# Altium footprint library 3D封装库.PcbLib: 716 footprints (part 43 of 45)
Each footprint in its own frame and in the unit in brackets; x right, y up, seen from the top. Pads: shape width x height; smd on the part's side, far side on the other; paste and mask are expansions set on the pad; w line width, h text height; cw(c..) or ccw(c..) is an arc to the next point about the centre after c.
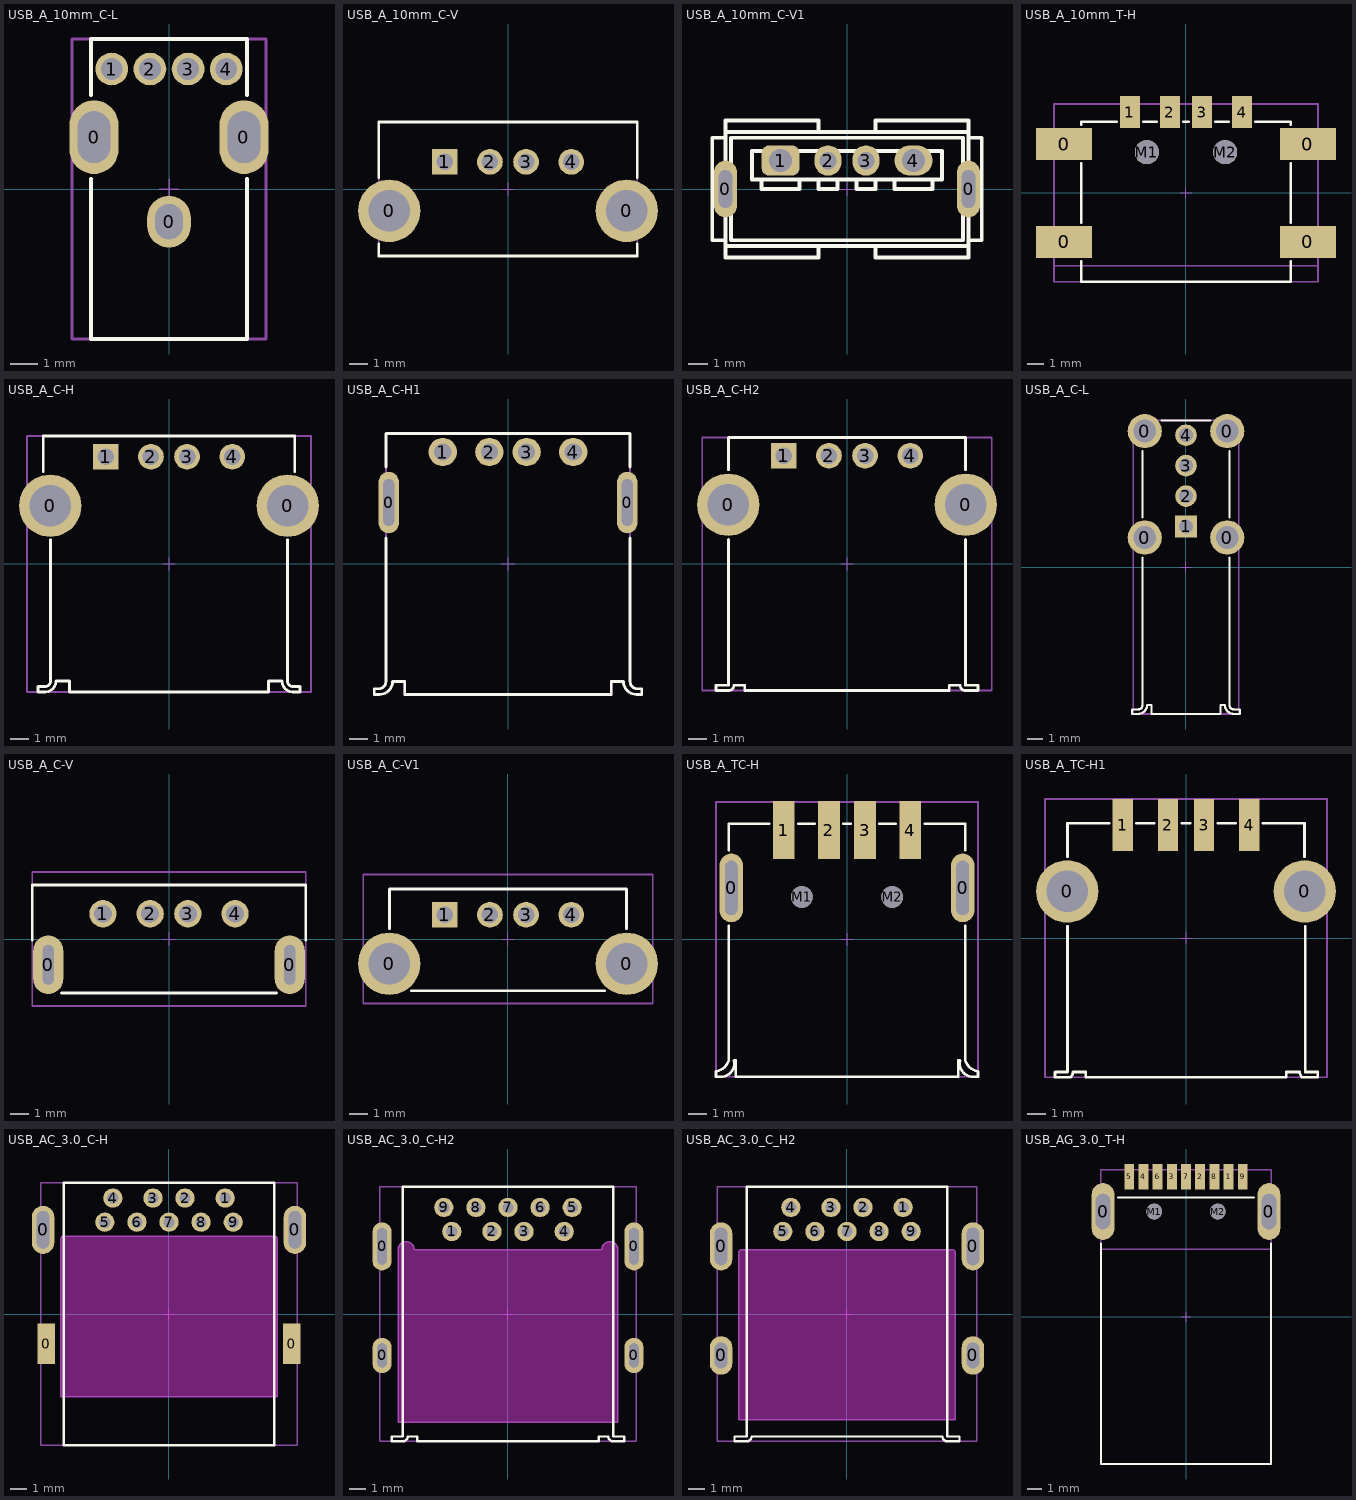
[diagram p42: the footprints below, top view; thin cyan lines are the x and y axes]

## USB_A_10mm_C-L [mm] "USB 2.0 Type A Up Right THT"
height 14.2
pads (7):
  oval 1.8x2.7 hole 1.2 slot 1.9 at 90 deg: 0(-2.75,1.9) 0(2.75,1.9)
  oval 1.6x1.9 hole 1 slot 1.3 at 90 deg: 0(0,-1.2)
  round 1.2 hole 0.8: 1(-2.1,4.4) 2(-0.7,4.4) 3(0.7,4.4) 4(2.1,4.4)
Top Overlay:
  lines w0.15: -2.86,0.36 -2.86,-5.5 2.86,-5.5 2.86,0.36 ; -2.86,3.44 -2.86,5.5 2.86,5.5 2.86,3.44
Mechanical 1:
  text "PCB Thickness 1.2mm" at -3.5,-6.3 h0.76
Mechanical 13:
  lines w0.1: -3.56,-5.5 3.56,-5.5 3.56,5.5 -3.56,5.5 -3.56,-5.5
Mechanical 15:
  lines w0.05: -0.35,0 0.35,0 ; 0,-0.35 0,0.35
3D body "614004184726.stp": height 14.3, standoff -2.74, extent -3.56,-5.5 3.56,5.5

## USB_A_10mm_C-V [mm] "USB 2.0 Type A Vertical Short Type THT"
height 10
pads (6):
  round 3.45 hole 2.3: 0(-6.57,-1.21) 0(6.57,-1.21)
  rect 1.42x1.42 hole 0.92: 1(-3.5,1.5)
  round 1.42 hole 0.92: 2(-1,1.5) 3(1,1.5) 4(3.5,1.5)
Top Overlay:
  lines w0.15: -7.15,-3.04 -7.15,-3.7 7.15,-3.7 7.15,-3.04 ; -7.15,0.62 -7.15,3.7 7.15,3.7 7.15,0.62
Mechanical 13:
  lines w0.1: -7.15,-3.7 7.15,-3.7 7.15,3.7 -7.15,3.7 -7.15,-3.7
Mechanical 15:
  lines w0.05: -0.35,0 0.35,0 ; 0,-0.35 0,0.35
3D body "614004185023.stp": height 10.05, standoff -2.95, extent -7.15,-3.7 7.15,3.7

## USB_A_10mm_C-V1 [mm] "USB 2.0 Type A Vertical Short Type THT"
height 10
pads (6):
  oval 1.2x3 hole 0.7 slot 2 at 90 deg: 0(-6.4,0) 0(6.4,0)
  rrect50% 2x1.6 hole 1.21: 1(-3.5,1.5)
  oval 1.42x1.6 hole 0.92: 2(-1,1.5) 3(1,1.5)
  oval 2x1.6 hole 1.21: 4(3.5,1.5)
Top Overlay:
  lines w0.203: -6.4,-2.7 -7.1,-2.7 -7.1,2.7 -6.4,2.7 ; -4.5,0.5 -4.5,0 -2.5,0 -2.5,0.5 ; -1.5,-3 -1.5,-3.6 -6.4,-3.6 -6.4,-3 ; -1.5,0.5 -1.5,0 -0.5,0 -0.5,0.5 ; -1.5,3 -1.5,3.6 -6.4,3.6 -6.4,3 ; 0.5,0.5 0.5,0 1.5,0 1.5,0.5 ; 1.5,-3 1.5,-3.6 6.4,-3.6 6.4,-3 ; 1.5,3 1.5,3.6 6.4,3.6 6.4,3 ; 2.5,0.5 2.5,0 4.5,0 4.5,0.5 ; 6.4,-2.7 7.1,-2.7 7.1,2.7 6.4,2.7 ; -6.4,-3 -6.4,3 ; -6.4,-3 6.4,-3 ; -6.4,3 6.4,3 ; 6.4,-3 6.4,3 ; -6.1,-2.7 -6.1,2.7 6.1,2.7 6.1,-2.7 -6.1,-2.7 ; -5,0.5 -5,2 5,2 5,0.5 -5,0.5
Mechanical 15:
  lines w0.05: -0.35,0 0.35,0 ; 0,-0.35 0,0.35
3D body "614004185023.stp": height 10.05, standoff -2.95, extent -7.15,-3.7 7.15,3.7

## USB_A_10mm_T-H [mm] "USB 2.0 Type A Horizontal SMT Short Type"
height 6.3
pads (10):
  rect 3.5x2 smd: 0(-7.625,-3.055) 0(-7.625,3.045) 0(7.625,-3.055) 0(7.625,3.045)
  rect 1.25x2 smd: 1(-3.5,5.045) 2(-1,5.045) 3(1,5.045) 4(3.5,5.045)
  round 1.5 hole 1.5 unplated: M1(-2.45,2.545) M2(2.45,2.545)
Top Overlay:
  lines w0.15: -6.55,-4.255 -6.55,-5.555 6.55,-5.555 6.55,-4.255 ; -6.55,-1.855 -6.55,1.845 ; -6.55,4.245 -6.55,4.445 -4.32,4.445 ; -2.68,4.445 -1.82,4.445 ; -0.18,4.445 0.18,4.445 ; 1.82,4.445 2.68,4.445 ; 4.32,4.445 6.55,4.445 6.55,4.245 ; 6.55,-1.855 6.55,1.845
Mechanical 1:
  lines w0.1: -8.25,-4.555 8.25,-4.555
  text "PCB Edge" at -2,-4.155 h1
Mechanical 13:
  lines w0.1: -8.25,-5.555 -8.25,5.555 8.25,5.555 8.25,-5.555 -8.25,-5.555
Mechanical 15:
  lines w0.05: -0.35,0 0.35,0 ; 0,-0.35 0,0.35
3D body "629104190121.stp": height 6.37, standoff -0.1, extent -8.25,-5.555 8.25,5.554

## USB_A_C-H [mm] "USB 2.0 Type A Horizontal THT"
height 6.9
pads (6):
  round 3.45 hole 2.3: 0(-6.57,3.225) 0(6.57,3.225)
  rect 1.42x1.42 hole 0.92: 1(-3.5,5.935)
  round 1.42 hole 0.92: 2(-1,5.935) 3(1,5.935) 4(3.5,5.935)
Top Overlay:
  lines w0.15: -6.95,5.115 -6.95,7.075 6.95,7.075 6.95,5.115 ; -6.55,1.335 -6.55,-6.475 cw(c-6.85,-6.475) -6.85,-6.775 -7.25,-6.775 -7.25,-7.075 -6.85,-7.075 ccw(c-6.85,-6.475) -6.25,-6.475 -5.5,-6.475 -5.5,-7.075 5.5,-7.075 5.5,-6.475 6.25,-6.475 ccw(c6.85,-6.475) 6.85,-7.075 7.25,-7.075 7.25,-6.775 6.85,-6.775 cw(c6.85,-6.475) 6.55,-6.475 6.55,1.335
Mechanical 1:
  text "PCB Thickness 1.6mm" at -3.15,-7.7 h0.76
Mechanical 13:
  lines w0.1: -7.85,-7.075 7.85,-7.075 7.85,7.075 -7.85,7.075 -7.85,-7.075
Mechanical 15:
  lines w0.05: -0.35,0 0.35,0 ; 0,-0.35 0,0.35
3D body "614004190021.stp": height 7.7, standoff -3.7, extent -7.85,-7.075 7.85,7.075

## USB_A_C-H1 [mm] "USB Type A Horizontal THR"
height 7.25
pads (6):
  oval 1.1x3.3 hole 0.6 slot 2.5 at 90 deg: 0(-6.4,3.3) 0(6.4,3.3)
  round 1.52 hole 0.92: 1(-3.5,6.01) 2(-1,6.01) 3(1,6.01) 4(3.5,6.01)
Top Overlay:
  lines w0.15: -6.972,-6.7 -7.175,-6.7 -7.175,-7 -6.895,-7 ccw(c-6.895,-6.3) -6.195,-6.3 -5.545,-6.3 -5.545,-7 5.545,-7 5.545,-6.3 6.195,-6.3 ccw(c6.895,-6.3) 6.895,-7 7.175,-7 7.175,-6.7 6.972,-6.7 ; -6.972,-6.699 ccw(c-6.95,-6.3) -6.55,-6.3 -6.55,1.4 ; -6.55,5.2 -6.55,7 6.55,7 6.55,5.2 ; 6.55,1.4 6.55,-6.3 ccw(c6.95,-6.3) 6.972,-6.699
Mechanical 13:
  lines w0.1: -6.972,-6.7 -7.175,-6.7 -7.175,-7 -6.895,-7 ccw(c-6.895,-6.3) -6.195,-6.3 -5.545,-6.3 -5.545,-7 5.545,-7 5.545,-6.3 6.195,-6.3 ccw(c6.895,-6.3) 6.895,-7 7.175,-7 7.175,-6.7 6.972,-6.7 ; -6.972,-6.699 ccw(c-6.95,-6.3) -6.55,-6.3 -6.55,7 6.55,7 6.55,-6.3 ccw(c6.95,-6.3) 6.972,-6.699
Mechanical 15:
  lines w0.05: -0.35,0 0.35,0 ; 0,-0.35 0,0.35
3D body "61410416021R.stp": height 7.5, standoff -2.19, extent -7.225,-7 7.225,7

## USB_A_C-H2 [mm] "USB 2.0 Type A Horizontal"
height 6.9
pads (6):
  round 3.45 hole 2.3: 0(-6.57,3.28) 0(6.57,3.28)
  rect 1.42x1.42 hole 0.92: 1(-3.5,5.99)
  round 1.42 hole 0.92: 2(-1,5.99) 3(1,5.99) 4(3.5,5.99)
Top Overlay:
  lines w0.15: -6.55,1.35 -6.55,-6.7 -7.25,-6.7 -7.25,-7 -6.56,-7 ccw(c-6.55,-6.7) -6.25,-6.7 -5.65,-6.7 -5.65,-7 5.65,-7 5.65,-6.7 6.25,-6.7 ccw(c6.55,-6.7) 6.56,-7 7.25,-7 7.25,-6.7 6.55,-6.7 6.55,1.35 ; -6.55,5.21 -6.55,7 6.55,7 6.55,5.21
Mechanical 1:
  text "PCB Thickness 1.6mm" at -3.15,-7.7 h0.76
Mechanical 13:
  lines w0.1: -8,-7 8,-7 8,7 -8,7 -8,-7
Mechanical 15:
  lines w0.05: -0.35,0 0.35,0 ; 0,-0.35 0,0.35
3D body "61400416021.stp": height 7.63, standoff -4.06, extent -7.999,-7 7.999,7

## USB_A_C-L [mm] "USB 2.0 Type A Up Right"
height 14.5
pads (8):
  round 2.25 hole 1.5: 0(-2.71,1.95) 0(-2.71,8.95) 0(2.71,1.95) 0(2.71,8.95)
  rect 1.42x1.42 hole 0.92: 1(0,2.68)
  round 1.42 hole 0.92: 2(0,4.68) 3(0,6.68) 4(0,8.68)
Top Overlay:
  lines w0.15: -2.86,0.63 -2.86,-9.06 cw(c-3.15,-9.06) -3.15,-9.35 -3.55,-9.35 -3.55,-9.65 -3.15,-9.65 ccw(c-3.15,-9.06) -2.56,-9.06 -2.27,-9.06 -2.27,-9.65 2.27,-9.65 2.27,-9.06 2.56,-9.06 ccw(c3.15,-9.06) 3.15,-9.65 3.55,-9.65 3.55,-9.35 3.15,-9.35 cw(c3.15,-9.06) 2.86,-9.06 2.86,0.63 ; -2.86,3.27 -2.86,7.64 ; -1.59,9.65 1.59,9.65 ; 2.86,3.27 2.86,7.64
Mechanical 13:
  lines w0.1: -3.475,-9.65 -3.475,9.65 3.475,9.65 3.475,-9.65 -3.475,-9.65
Mechanical 15:
  lines w0.05: -0.35,0 0.35,0 ; 0,-0.35 0,0.35
3D body "614004134726.stp": height 14.51, standoff -3.8, extent -3.55,-9.65 3.55,9.65

## USB_A_C-V [mm] "USB Type A Vertical THR"
height 14.9
pads (6):
  oval 1.6x3.1 hole 0.6 slot 2.1 at 90 deg: 0(-6.4,-1.37) 0(6.4,-1.37)
  round 1.45 hole 0.95: 1(-3.5,1.34) 2(-1,1.34) 3(1,1.34) 4(3.5,1.34)
Top Overlay:
  lines w0.15: -7.25,-0.05 -7.25,2.86 7.25,2.86 7.25,-0.05 ; -5.7,-2.86 5.7,-2.86
Mechanical 13:
  lines w0.1: -7.25,-3.56 7.25,-3.56 7.25,3.56 -7.25,3.56 -7.25,-3.56
Mechanical 15:
  lines w0.05: -0.35,0 0.35,0 ; 0,-0.35 0,0.35
3D body "614104135023R.stp": height 14.99, standoff -2.1, extent -7.25,-3.56 7.25,3.56

## USB_A_C-V1 [mm] "USB 2.0 Type A Vertical"
height 15
pads (6):
  round 3.45 hole 2.3: 0(-6.57,-1.37) 0(6.57,-1.37)
  rect 1.42x1.42 hole 0.92: 1(-3.5,1.34)
  round 1.42 hole 0.92: 2(-1,1.34) 3(1,1.34) 4(3.5,1.34)
Top Overlay:
  lines w0.15: -6.55,0.56 -6.55,2.76 6.55,2.76 6.55,0.56 ; -5.35,-2.86 5.34,-2.86
Mechanical 1:
  text "PCB Thickness 1.6mm" at -3.4,-4.1 h0.76
Mechanical 13:
  lines w0.1: -8,-3.56 8,-3.56 8,3.56 -8,3.56 -8,-3.56
Mechanical 15:
  lines w0.05: -0.35,0 0.35,0 ; 0,-0.35 0,0.35
3D body "614004135023.stp": height 15.02, standoff -4.28, extent -7.999,-3.56 7.999,3.56

## USB_A_TC-H [mm] "USB 2.0 Type A Horizontal SMT with pegs"
height 7
pads (8):
  oval 1.3x3.8 hole 0.7 slot 3 at 90 deg: 0(-6.4,2.85) 0(6.4,2.85)
  rect 1.2x3.2 smd: 1(-3.5,6.05) 2(-1,6.05) 3(1,6.05) 4(3.5,6.05)
  round 1.2 hole 1.2 unplated: M1(-2.5,2.35) M2(2.5,2.35)
Top Overlay:
  lines w0.15: -7.25,-7.308 -7.25,-7.6 -6.87,-7.599 ccw(c-6.983,-6.857) -6.25,-6.7 -6.15,-6.7 -6.15,-7.6 6.15,-7.6 6.15,-6.7 6.25,-6.7 ccw(c6.983,-6.857) 6.87,-7.599 7.25,-7.6 7.25,-7.308 ; -7.249,-7.308 ccw(c-7.39,-6.44) -6.55,-6.7 -6.55,0.76 ; -6.55,4.94 -6.55,6.4 -4.3,6.4 ; -2.7,6.4 -1.8,6.4 ; -0.2,6.4 0.2,6.4 ; 1.8,6.4 2.7,6.4 ; 4.3,6.4 6.55,6.4 6.55,4.94 ; 6.55,0.76 6.55,-6.7 ccw(c7.39,-6.44) 7.249,-7.308
Mechanical 1:
  text "PCB Thickness 1.6mm" at -3.15,-8.4 h0.76
Mechanical 13:
  lines w0.1: -7.25,-7.6 7.25,-7.6 7.25,7.6 -7.25,7.6 -7.25,-7.6
Mechanical 15:
  lines w0.05: -0.35,0 0.35,0 ; 0,-0.35 0,0.35
3D body "629104151021.stp": height 7.4, standoff -2.1, extent -7.25,-7.6 7.25,7.6

## USB_A_TC-H1 [mm] "USB 2.0 SMT Type A Horizontal"
height 7.12
pads (6):
  round 3.45 hole 2.3: 0(-6.57,2.58) 0(6.57,2.58)
  rect 1.12x2.88 smd: 1(-3.5,6.25) 2(-1,6.25) 3(1,6.25) 4(3.5,6.25)
Top Overlay:
  lines w0.15: -6.55,0.66 -6.55,-7.4 -7.25,-7.4 -7.25,-7.7 -6.39,-7.7 ; -6.55,4.5 -6.55,6.35 -4.26,6.35 ; -6.388,-7.702 ccw(c-6.65,-7.4) -6.25,-7.4 -5.55,-7.4 -5.55,-7.7 5.55,-7.7 5.55,-7.4 6.29,-7.4 ccw(c6.69,-7.4) 6.428,-7.702 ; -2.75,6.35 -1.76,6.35 ; -0.24,6.35 0.24,6.35 ; 1.75,6.35 2.74,6.35 ; 4.26,6.35 6.55,6.35 6.55,4.5 ; 6.43,-7.7 7.29,-7.7 7.29,-7.4 6.59,-7.4 6.59,0.66
Mechanical 13:
  lines w0.1: -7.8,-7.7 -7.8,7.7 7.8,7.7 7.8,-7.7 -7.8,-7.7
Mechanical 15:
  lines w0.05: -0.35,0 0.35,0 ; 0,-0.35 0,0.35
3D body "62900416021.stp": height 7.81, standoff -3.89, extent -7.81,-7.7 7.81,7.705

## USB_AC_3.0_C-H [mm] "USB 3.0 Type A Reverse Horizontal with Offset 1.75mm"
height 7.4
pads (13):
  oval 1.4x3 hole 0.8 slot 2.35 at 90 deg: 0(-7.85,5.245) 0(7.85,5.245)
  rect 1.1x2.5 smd: 0(-7.65,-1.855) 0(7.65,-1.855)
  round 1.2 hole 0.7: 1(3.5,7.225) 2(1,7.225) 3(-1,7.225) 4(-3.5,7.225) 5(-4,5.725) 6(-2,5.725) 7(0,5.725) 8(2,5.725) 9(4,5.725)
Top Overlay:
  lines w0.15: -6.55,-8.185 6.55,-8.185 6.55,8.185 -6.55,8.185 -6.55,-8.185
Keep-Out Layer:
  board cut-out: -6.75,-5.155 -6.75,4.675 -6.75,4.709 -6.724,4.771 -6.676,4.819 -6.614,4.845 -6.58,4.845 6.58,4.845 6.614,4.845 6.676,4.819 6.724,4.771 6.75,4.709 6.75,4.675 6.75,-5.155
Mechanical 1:
  lines w0.1: -6.75,-5.155 -6.75,4.675 cw(c-6.58,4.675) -6.58,4.845 6.58,4.845 cw(c6.58,4.675) 6.75,4.675 6.75,-5.155 -6.75,-5.155
  text "PCB Cutout Area" at -4.75,-0.15 h1.5
Mechanical 13:
  lines w0.1: -8,-8.185 8,-8.185 8,8.185 -8,8.185 -8,-8.185
Mechanical 15:
  lines w0.05: -0.35,0 0.35,0 ; 0,-0.35 0,0.35
3D body "692121330100.stp": height 2.99, standoff -4.41, extent -8,-8.185 8,8.185

## USB_AC_3.0_C-H2 [mm] "USB 3.0 Type A Horizontal with Offset 1.04mm"
height 3.9
pads (13):
  oval 1.2x2.2 hole 0.6 slot 1.5 at 90 deg: 0(-7.85,-2.585) 0(7.85,-2.585)
  oval 1.2x3 hole 0.6 slot 2.3 at 90 deg: 0(-7.85,4.215) 0(7.85,4.215)
  round 1.2 hole 0.7: 1(-3.5,5.145) 2(-1,5.145) 3(1,5.145) 4(3.5,5.145) 5(4,6.645) 6(2,6.645) 7(0,6.645) 8(-2,6.645) 9(-4,6.645)
Top Overlay:
  lines w0.15: -7.25,-7.935 -6.56,-7.935 ccw(c-6.55,-7.635) -6.25,-7.635 -5.65,-7.635 -5.65,-7.935 5.65,-7.935 5.65,-7.635 6.25,-7.635 ccw(c6.55,-7.635) 6.56,-7.935 7.25,-7.935 7.25,-7.635 6.55,-7.635 6.55,7.935 -6.55,7.935 -6.55,-7.635 -7.25,-7.635 -7.25,-7.935
Keep-Out Layer:
  board cut-out: -6.85,-6.755 6.85,-6.755 6.85,4.015 6.85,4.115 6.774,4.298 6.633,4.439 6.449,4.515 6.251,4.515 6.067,4.439 5.926,4.298 5.85,4.115 5.85,4.015 -5.85,4.015 -5.85,4.115 -5.926,4.298 -6.067,4.439 -6.251,4.515 -6.449,4.515 -6.633,4.439 -6.774,4.298 -6.85,4.115 -6.85,4.015
Mechanical 1:
  lines w0.1: -6.85,-6.755 6.85,-6.755 6.85,4.015 ccw(c6.35,4.015) 5.85,4.015 -5.85,4.015 ccw(c-6.35,4.015) -6.85,4.015 -6.85,-6.755
  text "PCB Cutout Area" at -4.7,-1.425 h1.5
Mechanical 13:
  lines w0.1: -8,-7.935 -8,7.935 8,7.935 8,-7.935 -8,-7.935
Mechanical 15:
  lines w0.05: -0.35,0 0.35,0 ; 0,-0.35 0,0.35
3D body "692121230100.stp": height 4.6, standoff -2.52, extent -8,-7.935 8,7.935

## USB_AC_3.0_C_H2 [mm] "USB 3.0 Type A Reverse Horizontal w. Offset 0.14mm"
height 5.12
pads (13):
  oval 1.4x2.4 hole 0.8 slot 1.6 at 90 deg: 0(-7.85,-2.585) 0(7.85,-2.585)
  oval 1.4x3 hole 0.8 slot 2.35 at 90 deg: 0(-7.85,4.215) 0(7.85,4.215)
  round 1.2 hole 0.7: 1(3.5,6.645) 2(1,6.645) 3(-1,6.645) 4(-3.5,6.645) 5(-4,5.145) 6(-2,5.145) 7(0,5.145) 8(2,5.145) 9(4,5.145)
Top Overlay:
  lines w0.15: -7.01,-7.935 -6.26,-7.935 ccw(c-6.25,-7.635) -5.95,-7.635 5.95,-7.635 ccw(c6.25,-7.635) 6.26,-7.935 7.01,-7.935 7.01,-7.635 6.25,-7.635 6.25,7.935 -6.25,7.935 -6.25,-7.635 -7.01,-7.635 -7.01,-7.935
Keep-Out Layer:
  board cut-out: -6.75,-6.585 6.75,-6.585 6.75,3.815 6.75,3.855 6.72,3.928 6.663,3.985 6.59,4.015 6.55,4.015 -6.55,4.015 -6.59,4.015 -6.663,3.985 -6.72,3.928 -6.75,3.855 -6.75,3.815
Mechanical 1:
  lines w0.1: -6.75,-6.585 6.75,-6.585 6.75,3.815 ccw(c6.55,3.815) 6.55,4.015 -6.55,4.015 ccw(c-6.55,3.815) -6.75,3.815 -6.75,-6.585
  text "PCB Cutout Area" at -5,-1.57 h1.5
Mechanical 13:
  lines w0.1: -8.078,-7.935 8.078,-7.935 8.078,7.935 -8.078,7.935 -8.078,-7.935
Mechanical 15:
  lines w0.05: -0.35,0 0.35,0 ; 0,-0.35 0,0.35
3D body "692121130100.stp": height 4.05, standoff -3.67, extent -8.078,-7.935 8.078,7.935

## USB_AG_3.0_T-H [mm] "USB 3.0 Type A SMT Plug with Clip"
height 4.5
pads (13):
  oval 1.6x4 hole 1 slot 2.5 at 90 deg: 0(-5.85,7.425) 0(5.85,7.425)
  rect 0.7x1.8 smd: 1(3,9.875) 2(1,9.875) 3(-1,9.875) 4(-3,9.875) 5(-4,9.875) 6(-2,9.875) 7(0,9.875) 8(2,9.875) 9(4,9.875)
  round 1.1 hole 1.1 unplated: M1(-2.25,7.425) M2(2.25,7.425)
Top Overlay:
  lines w0.15: -6,5.15 -6,-10.375 6,-10.375 6,5.15 ; -4.8,8.425 4.8,8.425
Mechanical 1:
  lines w0.1: -6,4.775 6,4.775
  text "PCB Edge" at -2,3.725 h1
Mechanical 13:
  lines w0.1: -6,-10.375 -6,10.375 6,10.375 6,-10.375 -6,-10.375
Mechanical 15:
  lines w0.05: -0.35,0 0.35,0 ; 0,-0.35 0,0.35
3D body "692112030100.stp": height 1.85, standoff -2.65, extent -6,-10.375 6,10.375